# Altium footprint library con-samtec.PCBLIB: 805 footprints (part 4 of 55)
Each footprint in its own frame and in the unit in brackets; x right, y up, seen from the top. Pads: shape width x height; smd on the part's side, far side on the other; paste and mask are expansions set on the pad; w line width, h text height; cw(c..) or ccw(c..) is an arc to the next point about the centre after c.
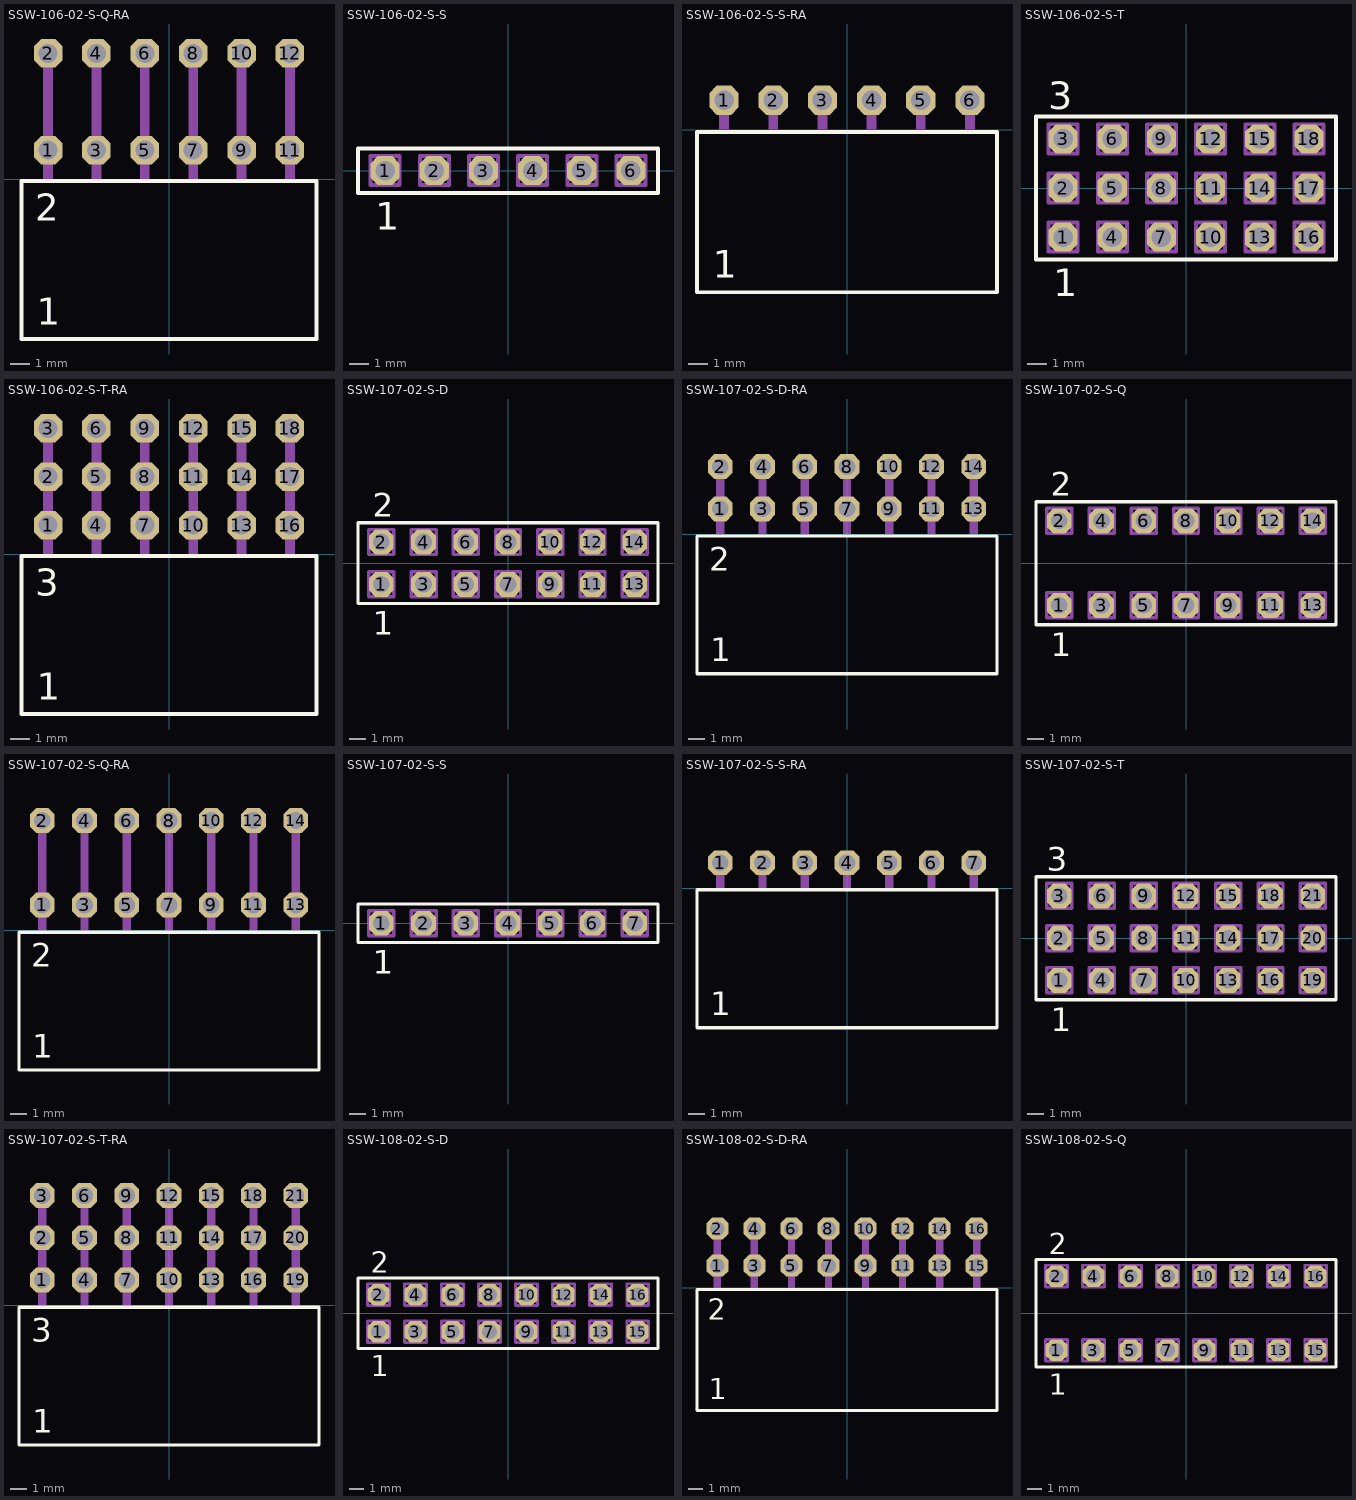
[diagram p3: the footprints below, top view; thin cyan lines are the x and y axes]

## SSW-106-02-S-Q-RA [mil]
pads (12):
  oct 59.06x59.06 hole 39.37: 1(-250,60) 2(-250,260) 3(-150,60) 4(-150,260) 5(-50,60) 6(-50,260) 7(50,60) 8(50,260) 9(150,60) 10(150,260) 11(250,60) 12(250,260)
Top Overlay:
  lines w8: -305.08,-330.55 305.08,-330.55 305.08,-4.17 -305.08,-4.17 -305.08,-330.55
  text "1" at -273.43,-301.18 h56.1
  text "2" at -276.38,-86.61 h56.1
Mechanical 16:
  rectangle: -260,0 -240,270
  rectangle: -160,0 -140,270
  rectangle: -60,0 -40,270
  rectangle: 40,0 60,270
  rectangle: 140,0 160,270
  rectangle: 240,0 260,270

## SSW-106-02-S-S [mm]
pads (6):
  oct 1.5x1.5 hole 1: 1(-6.35,0) 2(-3.81,0) 3(-1.27,0) 4(1.27,0) 5(3.81,0) 6(6.35,0)
Top Overlay:
  lines w0.203: -7.749,-1.155 7.749,-1.155 7.749,1.155 -7.749,1.155 -7.749,-1.155
  text "1" at -6.858,-3.048 h1.42
Mechanical 16:
  lines w0.203: -7.095,-0.745 -5.595,-0.745 -5.595,0.755 -7.095,0.755 -7.095,-0.745 ; -4.555,-0.745 -3.055,-0.745 -3.055,0.755 -4.555,0.755 -4.555,-0.745 ; -2.015,-0.745 -0.515,-0.745 -0.515,0.755 -2.015,0.755 -2.015,-0.745 ; 0.525,-0.745 2.025,-0.745 2.025,0.755 0.525,0.755 0.525,-0.745 ; 3.065,-0.745 4.565,-0.745 4.565,0.755 3.065,0.755 3.065,-0.745 ; 5.605,-0.745 7.105,-0.745 7.105,0.755 5.605,0.755 5.605,-0.745

## SSW-106-02-S-S-RA [mil]
pads (6):
  oct 59.06x59.06 hole 39.37: 1(-250,60) 2(-150,60) 3(-50,60) 4(50,60) 5(150,60) 6(250,60)
Top Overlay:
  lines w8: -305.08,-330.55 305.08,-330.55 305.08,-4.17 -305.08,-4.17 -305.08,-330.55
  text "1" at -273.43,-301.18 h56.1
Mechanical 16:
  rectangle: -260,0 -240,70
  rectangle: -160,0 -140,70
  rectangle: -60,0 -40,70
  rectangle: 40,0 60,70
  rectangle: 140,0 160,70
  rectangle: 240,0 260,70

## SSW-106-02-S-T [mm]
pads (18):
  oct 1.5x1.5 hole 1: 1(-6.35,-2.54) 2(-6.35,0) 3(-6.35,2.54) 4(-3.81,-2.54) 5(-3.81,0) 6(-3.81,2.54) 7(-1.27,-2.54) 8(-1.27,0) 9(-1.27,2.54) 10(1.27,-2.54) 11(1.27,0) 12(1.27,2.54) 13(3.81,-2.54) 14(3.81,0) 15(3.81,2.54) 16(6.35,-2.54) 17(6.35,0) 18(6.35,2.54)
Top Overlay:
  lines w0.203: -7.749,-3.695 7.749,-3.695 7.749,3.695 -7.749,3.695 -7.749,-3.695
  text "1" at -6.858,-5.588 h1.42
  text "3" at -7.112,4.064 h1.42
Mechanical 16:
  lines w0.203: -7.095,-3.285 -5.595,-3.285 -5.595,-1.785 -7.095,-1.785 -7.095,-3.285 ; -7.095,-0.745 -5.595,-0.745 -5.595,0.755 -7.095,0.755 -7.095,-0.745 ; -7.095,1.795 -5.595,1.795 -5.595,3.295 -7.095,3.295 -7.095,1.795 ; -4.555,-3.285 -3.055,-3.285 -3.055,-1.785 -4.555,-1.785 -4.555,-3.285 ; -4.555,-0.745 -3.055,-0.745 -3.055,0.755 -4.555,0.755 -4.555,-0.745 ; -4.555,1.795 -3.055,1.795 -3.055,3.295 -4.555,3.295 -4.555,1.795 ; -2.015,-3.285 -0.515,-3.285 -0.515,-1.785 -2.015,-1.785 -2.015,-3.285 ; -2.015,-0.745 -0.515,-0.745 -0.515,0.755 -2.015,0.755 -2.015,-0.745 ; -2.015,1.795 -0.515,1.795 -0.515,3.295 -2.015,3.295 -2.015,1.795 ; 0.525,-3.285 2.025,-3.285 2.025,-1.785 0.525,-1.785 0.525,-3.285 ; 0.525,-0.745 2.025,-0.745 2.025,0.755 0.525,0.755 0.525,-0.745 ; 0.525,1.795 2.025,1.795 2.025,3.295 0.525,3.295 0.525,1.795 ; 3.065,-3.285 4.565,-3.285 4.565,-1.785 3.065,-1.785 3.065,-3.285 ; 3.065,-0.745 4.565,-0.745 4.565,0.755 3.065,0.755 3.065,-0.745 ; 3.065,1.795 4.565,1.795 4.565,3.295 3.065,3.295 3.065,1.795 ; 5.605,-3.285 7.105,-3.285 7.105,-1.785 5.605,-1.785 5.605,-3.285 ; 5.605,-0.745 7.105,-0.745 7.105,0.755 5.605,0.755 5.605,-0.745 ; 5.605,1.795 7.105,1.795 7.105,3.295 5.605,3.295 5.605,1.795

## SSW-106-02-S-T-RA [mil]
pads (18):
  oct 59.06x59.06 hole 39.37: 1(-250,60) 2(-250,160) 3(-250,260) 4(-150,60) 5(-150,160) 6(-150,260) 7(-50,60) 8(-50,160) 9(-50,260) 10(50,60) 11(50,160) 12(50,260) 13(150,60) 14(150,160) 15(150,260) 16(250,60) 17(250,160) 18(250,260)
Top Overlay:
  lines w8: -305.08,-330.55 305.08,-330.55 305.08,-4.17 -305.08,-4.17 -305.08,-330.55
  text "1" at -273.43,-301.18 h56.1
  text "3" at -276.38,-86.61 h56.1
Mechanical 16:
  rectangle: -260,0 -240,270
  rectangle: -160,0 -140,270
  rectangle: -60,0 -40,270
  rectangle: 40,0 60,270
  rectangle: 140,0 160,270
  rectangle: 240,0 260,270

## SSW-107-02-S-D [mm]
pads (14):
  oct 1.5x1.5 hole 1: 1(-7.62,-1.27) 2(-7.62,1.27) 3(-5.08,-1.27) 4(-5.08,1.27) 5(-2.54,-1.27) 6(-2.54,1.27) 7(0,-1.27) 8(0,1.27) 9(2.54,-1.27) 10(2.54,1.27) 11(5.08,-1.27) 12(5.08,1.27) 13(7.62,-1.27) 14(7.62,1.27)
Top Overlay:
  lines w0.203: -9.019,-2.425 9.019,-2.425 9.019,2.425 -9.019,2.425 -9.019,-2.425
  text "1" at -8.128,-4.318 h1.42
  text "2" at -8.128,2.794 h1.42
Mechanical 16:
  lines w0.203: -8.365,-2.015 -6.865,-2.015 -6.865,-0.515 -8.365,-0.515 -8.365,-2.015 ; -8.365,0.525 -6.865,0.525 -6.865,2.025 -8.365,2.025 -8.365,0.525 ; -5.825,-2.015 -4.325,-2.015 -4.325,-0.515 -5.825,-0.515 -5.825,-2.015 ; -5.825,0.525 -4.325,0.525 -4.325,2.025 -5.825,2.025 -5.825,0.525 ; -3.285,-2.015 -1.785,-2.015 -1.785,-0.515 -3.285,-0.515 -3.285,-2.015 ; -3.285,0.525 -1.785,0.525 -1.785,2.025 -3.285,2.025 -3.285,0.525 ; -0.745,-2.015 0.755,-2.015 0.755,-0.515 -0.745,-0.515 -0.745,-2.015 ; -0.745,0.525 0.755,0.525 0.755,2.025 -0.745,2.025 -0.745,0.525 ; 1.795,-2.015 3.295,-2.015 3.295,-0.515 1.795,-0.515 1.795,-2.015 ; 1.795,0.525 3.295,0.525 3.295,2.025 1.795,2.025 1.795,0.525 ; 4.335,-2.015 5.835,-2.015 5.835,-0.515 4.335,-0.515 4.335,-2.015 ; 4.335,0.525 5.835,0.525 5.835,2.025 4.335,2.025 4.335,0.525 ; 6.875,-2.015 8.375,-2.015 8.375,-0.515 6.875,-0.515 6.875,-2.015 ; 6.875,0.525 8.375,0.525 8.375,2.025 6.875,2.025 6.875,0.525

## SSW-107-02-S-D-RA [mil]
pads (14):
  oct 59.06x59.06 hole 39.37: 1(-300,60) 2(-300,160) 3(-200,60) 4(-200,160) 5(-100,60) 6(-100,160) 7(0,60) 8(0,160) 9(100,60) 10(100,160) 11(200,60) 12(200,160) 13(300,60) 14(300,160)
Top Overlay:
  lines w8: -355.08,-330.55 355.08,-330.55 355.08,-4.17 -355.08,-4.17 -355.08,-330.55
  text "1" at -323.43,-301.18 h56.1
  text "2" at -326.38,-86.61 h56.1
Mechanical 16:
  rectangle: -310,0 -290,170
  rectangle: -210,0 -190,170
  rectangle: -110,0 -90,170
  rectangle: -10,0 10,170
  rectangle: 90,0 110,170
  rectangle: 190,0 210,170
  rectangle: 290,0 310,170

## SSW-107-02-S-Q [mm]
pads (14):
  oct 1.5x1.5 hole 1: 1(-7.62,-2.54) 2(-7.62,2.54) 3(-5.08,-2.54) 4(-5.08,2.54) 5(-2.54,-2.54) 6(-2.54,2.54) 7(0,-2.54) 8(0,2.54) 9(2.54,-2.54) 10(2.54,2.54) 11(5.08,-2.54) 12(5.08,2.54) 13(7.62,-2.54) 14(7.62,2.54)
Top Overlay:
  lines w0.203: -9.019,-3.695 9.019,-3.695 9.019,3.695 -9.019,3.695 -9.019,-3.695
  text "1" at -8.128,-5.588 h1.42
  text "2" at -8.128,4.064 h1.42
Mechanical 16:
  lines w0.203: -8.365,-3.285 -6.865,-3.285 -6.865,-1.785 -8.365,-1.785 -8.365,-3.285 ; -8.365,1.795 -6.865,1.795 -6.865,3.295 -8.365,3.295 -8.365,1.795 ; -5.825,-3.285 -4.325,-3.285 -4.325,-1.785 -5.825,-1.785 -5.825,-3.285 ; -5.825,1.795 -4.325,1.795 -4.325,3.295 -5.825,3.295 -5.825,1.795 ; -3.285,-3.285 -1.785,-3.285 -1.785,-1.785 -3.285,-1.785 -3.285,-3.285 ; -3.285,1.795 -1.785,1.795 -1.785,3.295 -3.285,3.295 -3.285,1.795 ; -0.745,-3.285 0.755,-3.285 0.755,-1.785 -0.745,-1.785 -0.745,-3.285 ; -0.745,1.795 0.755,1.795 0.755,3.295 -0.745,3.295 -0.745,1.795 ; 1.795,-3.285 3.295,-3.285 3.295,-1.785 1.795,-1.785 1.795,-3.285 ; 1.795,1.795 3.295,1.795 3.295,3.295 1.795,3.295 1.795,1.795 ; 4.335,-3.285 5.835,-3.285 5.835,-1.785 4.335,-1.785 4.335,-3.285 ; 4.335,1.795 5.835,1.795 5.835,3.295 4.335,3.295 4.335,1.795 ; 6.875,-3.285 8.375,-3.285 8.375,-1.785 6.875,-1.785 6.875,-3.285 ; 6.875,1.795 8.375,1.795 8.375,3.295 6.875,3.295 6.875,1.795

## SSW-107-02-S-Q-RA [mil]
pads (14):
  oct 59.06x59.06 hole 39.37: 1(-300,60) 2(-300,260) 3(-200,60) 4(-200,260) 5(-100,60) 6(-100,260) 7(0,60) 8(0,260) 9(100,60) 10(100,260) 11(200,60) 12(200,260) 13(300,60) 14(300,260)
Top Overlay:
  lines w8: -355.08,-330.55 355.08,-330.55 355.08,-4.17 -355.08,-4.17 -355.08,-330.55
  text "1" at -323.43,-301.18 h56.1
  text "2" at -326.38,-86.61 h56.1
Mechanical 16:
  rectangle: -310,0 -290,270
  rectangle: -210,0 -190,270
  rectangle: -110,0 -90,270
  rectangle: -10,0 10,270
  rectangle: 90,0 110,270
  rectangle: 190,0 210,270
  rectangle: 290,0 310,270

## SSW-107-02-S-S [mm]
pads (7):
  oct 1.5x1.5 hole 1: 1(-7.62,0) 2(-5.08,0) 3(-2.54,0) 4(0,0) 5(2.54,0) 6(5.08,0) 7(7.62,0)
Top Overlay:
  lines w0.203: -9.019,-1.155 9.019,-1.155 9.019,1.155 -9.019,1.155 -9.019,-1.155
  text "1" at -8.128,-3.048 h1.42
Mechanical 16:
  lines w0.203: -8.365,-0.745 -6.865,-0.745 -6.865,0.755 -8.365,0.755 -8.365,-0.745 ; -5.825,-0.745 -4.325,-0.745 -4.325,0.755 -5.825,0.755 -5.825,-0.745 ; -3.285,-0.745 -1.785,-0.745 -1.785,0.755 -3.285,0.755 -3.285,-0.745 ; -0.745,-0.745 0.755,-0.745 0.755,0.755 -0.745,0.755 -0.745,-0.745 ; 1.795,-0.745 3.295,-0.745 3.295,0.755 1.795,0.755 1.795,-0.745 ; 4.335,-0.745 5.835,-0.745 5.835,0.755 4.335,0.755 4.335,-0.745 ; 6.875,-0.745 8.375,-0.745 8.375,0.755 6.875,0.755 6.875,-0.745

## SSW-107-02-S-S-RA [mil]
pads (7):
  oct 59.06x59.06 hole 39.37: 1(-300,60) 2(-200,60) 3(-100,60) 4(0,60) 5(100,60) 6(200,60) 7(300,60)
Top Overlay:
  lines w8: -355.08,-330.55 355.08,-330.55 355.08,-4.17 -355.08,-4.17 -355.08,-330.55
  text "1" at -323.43,-301.18 h56.1
Mechanical 16:
  rectangle: -310,0 -290,70
  rectangle: -210,0 -190,70
  rectangle: -110,0 -90,70
  rectangle: -10,0 10,70
  rectangle: 90,0 110,70
  rectangle: 190,0 210,70
  rectangle: 290,0 310,70

## SSW-107-02-S-T [mm]
pads (21):
  oct 1.5x1.5 hole 1: 1(-7.62,-2.54) 2(-7.62,0) 3(-7.62,2.54) 4(-5.08,-2.54) 5(-5.08,0) 6(-5.08,2.54) 7(-2.54,-2.54) 8(-2.54,0) 9(-2.54,2.54) 10(0,-2.54) 11(0,0) 12(0,2.54) 13(2.54,-2.54) 14(2.54,0) 15(2.54,2.54) 16(5.08,-2.54) 17(5.08,0) 18(5.08,2.54) 19(7.62,-2.54) 20(7.62,0) 21(7.62,2.54)
Top Overlay:
  lines w0.203: -9.019,-3.695 9.019,-3.695 9.019,3.695 -9.019,3.695 -9.019,-3.695
  text "1" at -8.128,-5.588 h1.42
  text "3" at -8.382,4.064 h1.42
Mechanical 16:
  lines w0.203: -8.365,-3.285 -6.865,-3.285 -6.865,-1.785 -8.365,-1.785 -8.365,-3.285 ; -8.365,-0.745 -6.865,-0.745 -6.865,0.755 -8.365,0.755 -8.365,-0.745 ; -8.365,1.795 -6.865,1.795 -6.865,3.295 -8.365,3.295 -8.365,1.795 ; -5.825,-3.285 -4.325,-3.285 -4.325,-1.785 -5.825,-1.785 -5.825,-3.285 ; -5.825,-0.745 -4.325,-0.745 -4.325,0.755 -5.825,0.755 -5.825,-0.745 ; -5.825,1.795 -4.325,1.795 -4.325,3.295 -5.825,3.295 -5.825,1.795 ; -3.285,-3.285 -1.785,-3.285 -1.785,-1.785 -3.285,-1.785 -3.285,-3.285 ; -3.285,-0.745 -1.785,-0.745 -1.785,0.755 -3.285,0.755 -3.285,-0.745 ; -3.285,1.795 -1.785,1.795 -1.785,3.295 -3.285,3.295 -3.285,1.795 ; -0.745,-3.285 0.755,-3.285 0.755,-1.785 -0.745,-1.785 -0.745,-3.285 ; -0.745,-0.745 0.755,-0.745 0.755,0.755 -0.745,0.755 -0.745,-0.745 ; -0.745,1.795 0.755,1.795 0.755,3.295 -0.745,3.295 -0.745,1.795 ; 1.795,-3.285 3.295,-3.285 3.295,-1.785 1.795,-1.785 1.795,-3.285 ; 1.795,-0.745 3.295,-0.745 3.295,0.755 1.795,0.755 1.795,-0.745 ; 1.795,1.795 3.295,1.795 3.295,3.295 1.795,3.295 1.795,1.795 ; 4.335,-3.285 5.835,-3.285 5.835,-1.785 4.335,-1.785 4.335,-3.285 ; 4.335,-0.745 5.835,-0.745 5.835,0.755 4.335,0.755 4.335,-0.745 ; 4.335,1.795 5.835,1.795 5.835,3.295 4.335,3.295 4.335,1.795 ; 6.875,-3.285 8.375,-3.285 8.375,-1.785 6.875,-1.785 6.875,-3.285 ; 6.875,-0.745 8.375,-0.745 8.375,0.755 6.875,0.755 6.875,-0.745 ; 6.875,1.795 8.375,1.795 8.375,3.295 6.875,3.295 6.875,1.795

## SSW-107-02-S-T-RA [mil]
pads (21):
  oct 59.06x59.06 hole 39.37: 1(-300,60) 2(-300,160) 3(-300,260) 4(-200,60) 5(-200,160) 6(-200,260) 7(-100,60) 8(-100,160) 9(-100,260) 10(0,60) 11(0,160) 12(0,260) 13(100,60) 14(100,160) 15(100,260) 16(200,60) 17(200,160) 18(200,260) 19(300,60) 20(300,160) 21(300,260)
Top Overlay:
  lines w8: -355.08,-330.55 355.08,-330.55 355.08,-4.17 -355.08,-4.17 -355.08,-330.55
  text "1" at -323.43,-301.18 h56.1
  text "3" at -326.38,-86.61 h56.1
Mechanical 16:
  rectangle: -310,0 -290,270
  rectangle: -210,0 -190,270
  rectangle: -110,0 -90,270
  rectangle: -10,0 10,270
  rectangle: 90,0 110,270
  rectangle: 190,0 210,270
  rectangle: 290,0 310,270

## SSW-108-02-S-D [mm]
pads (16):
  oct 1.5x1.5 hole 1: 1(-8.89,-1.27) 2(-8.89,1.27) 3(-6.35,-1.27) 4(-6.35,1.27) 5(-3.81,-1.27) 6(-3.81,1.27) 7(-1.27,-1.27) 8(-1.27,1.27) 9(1.27,-1.27) 10(1.27,1.27) 11(3.81,-1.27) 12(3.81,1.27) 13(6.35,-1.27) 14(6.35,1.27) 15(8.89,-1.27) 16(8.89,1.27)
Top Overlay:
  lines w0.203: -10.289,-2.425 10.289,-2.425 10.289,2.425 -10.289,2.425 -10.289,-2.425
  text "1" at -9.398,-4.318 h1.42
  text "2" at -9.398,2.794 h1.42
Mechanical 16:
  lines w0.203: -9.635,-2.015 -8.135,-2.015 -8.135,-0.515 -9.635,-0.515 -9.635,-2.015 ; -9.635,0.525 -8.135,0.525 -8.135,2.025 -9.635,2.025 -9.635,0.525 ; -7.095,-2.015 -5.595,-2.015 -5.595,-0.515 -7.095,-0.515 -7.095,-2.015 ; -7.095,0.525 -5.595,0.525 -5.595,2.025 -7.095,2.025 -7.095,0.525 ; -4.555,-2.015 -3.055,-2.015 -3.055,-0.515 -4.555,-0.515 -4.555,-2.015 ; -4.555,0.525 -3.055,0.525 -3.055,2.025 -4.555,2.025 -4.555,0.525 ; -2.015,-2.015 -0.515,-2.015 -0.515,-0.515 -2.015,-0.515 -2.015,-2.015 ; -2.015,0.525 -0.515,0.525 -0.515,2.025 -2.015,2.025 -2.015,0.525 ; 0.525,-2.015 2.025,-2.015 2.025,-0.515 0.525,-0.515 0.525,-2.015 ; 0.525,0.525 2.025,0.525 2.025,2.025 0.525,2.025 0.525,0.525 ; 3.065,-2.015 4.565,-2.015 4.565,-0.515 3.065,-0.515 3.065,-2.015 ; 3.065,0.525 4.565,0.525 4.565,2.025 3.065,2.025 3.065,0.525 ; 5.605,-2.015 7.105,-2.015 7.105,-0.515 5.605,-0.515 5.605,-2.015 ; 5.605,0.525 7.105,0.525 7.105,2.025 5.605,2.025 5.605,0.525 ; 8.145,-2.015 9.645,-2.015 9.645,-0.515 8.145,-0.515 8.145,-2.015 ; 8.145,0.525 9.645,0.525 9.645,2.025 8.145,2.025 8.145,0.525

## SSW-108-02-S-D-RA [mil]
pads (16):
  oct 59.06x59.06 hole 39.37: 1(-350,60) 2(-350,160) 3(-250,60) 4(-250,160) 5(-150,60) 6(-150,160) 7(-50,60) 8(-50,160) 9(50,60) 10(50,160) 11(150,60) 12(150,160) 13(250,60) 14(250,160) 15(350,60) 16(350,160)
Top Overlay:
  lines w8: -405.08,-330.55 405.08,-330.55 405.08,-4.17 -405.08,-4.17 -405.08,-330.55
  text "1" at -373.43,-301.18 h56.1
  text "2" at -376.38,-86.61 h56.1
Mechanical 16:
  rectangle: -360,0 -340,170
  rectangle: -260,0 -240,170
  rectangle: -160,0 -140,170
  rectangle: -60,0 -40,170
  rectangle: 40,0 60,170
  rectangle: 140,0 160,170
  rectangle: 240,0 260,170
  rectangle: 340,0 360,170

## SSW-108-02-S-Q [mm]
pads (16):
  oct 1.5x1.5 hole 1: 1(-8.89,-2.54) 2(-8.89,2.54) 3(-6.35,-2.54) 4(-6.35,2.54) 5(-3.81,-2.54) 6(-3.81,2.54) 7(-1.27,-2.54) 8(-1.27,2.54) 9(1.27,-2.54) 10(1.27,2.54) 11(3.81,-2.54) 12(3.81,2.54) 13(6.35,-2.54) 14(6.35,2.54) 15(8.89,-2.54) 16(8.89,2.54)
Top Overlay:
  lines w0.203: -10.289,-3.695 10.289,-3.695 10.289,3.695 -10.289,3.695 -10.289,-3.695
  text "1" at -9.398,-5.588 h1.42
  text "2" at -9.398,4.064 h1.42
Mechanical 16:
  lines w0.203: -9.635,-3.285 -8.135,-3.285 -8.135,-1.785 -9.635,-1.785 -9.635,-3.285 ; -9.635,1.795 -8.135,1.795 -8.135,3.295 -9.635,3.295 -9.635,1.795 ; -7.095,-3.285 -5.595,-3.285 -5.595,-1.785 -7.095,-1.785 -7.095,-3.285 ; -7.095,1.795 -5.595,1.795 -5.595,3.295 -7.095,3.295 -7.095,1.795 ; -4.555,-3.285 -3.055,-3.285 -3.055,-1.785 -4.555,-1.785 -4.555,-3.285 ; -4.555,1.795 -3.055,1.795 -3.055,3.295 -4.555,3.295 -4.555,1.795 ; -2.015,-3.285 -0.515,-3.285 -0.515,-1.785 -2.015,-1.785 -2.015,-3.285 ; -2.015,1.795 -0.515,1.795 -0.515,3.295 -2.015,3.295 -2.015,1.795 ; 0.525,-3.285 2.025,-3.285 2.025,-1.785 0.525,-1.785 0.525,-3.285 ; 0.525,1.795 2.025,1.795 2.025,3.295 0.525,3.295 0.525,1.795 ; 3.065,-3.285 4.565,-3.285 4.565,-1.785 3.065,-1.785 3.065,-3.285 ; 3.065,1.795 4.565,1.795 4.565,3.295 3.065,3.295 3.065,1.795 ; 5.605,-3.285 7.105,-3.285 7.105,-1.785 5.605,-1.785 5.605,-3.285 ; 5.605,1.795 7.105,1.795 7.105,3.295 5.605,3.295 5.605,1.795 ; 8.145,-3.285 9.645,-3.285 9.645,-1.785 8.145,-1.785 8.145,-3.285 ; 8.145,1.795 9.645,1.795 9.645,3.295 8.145,3.295 8.145,1.795